# Altium footprint library Conectores.PcbLib: 122 footprints (part 4 of 8)
Each footprint in its own frame and in the unit in brackets; x right, y up, seen from the top. Pads: shape width x height; smd on the part's side, far side on the other; paste and mask are expansions set on the pad; w line width, h text height; cw(c..) or ccw(c..) is an arc to the next point about the centre after c.
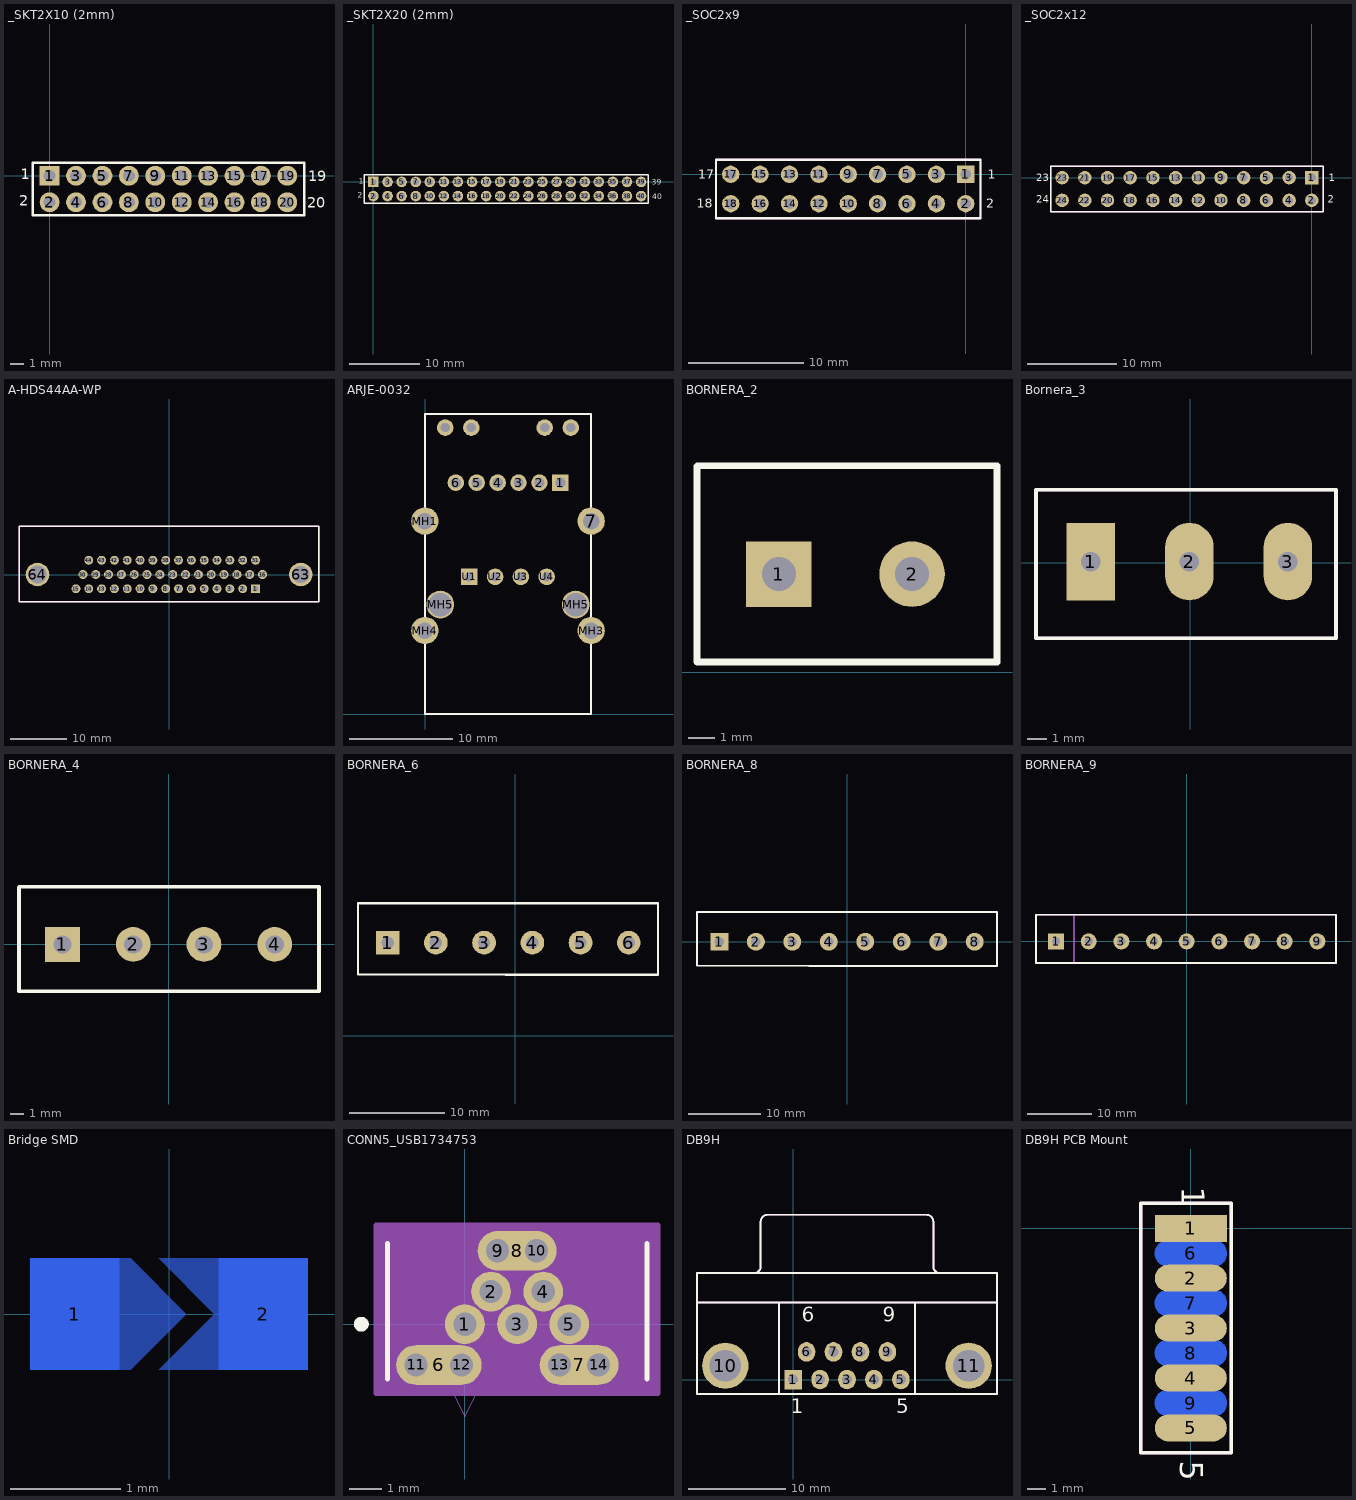
[diagram p3: the footprints below, top view; thin cyan lines are the x and y axes]

## _SKT2X10 (2mm) [mm] "Connector Socket; 20x2 Position (2mm pitch) P/N: SQW-110-01-F-D"
pads (20):
  rect 1.5x1.5 hole 0.9: 1(0,0)
  round 1.5 hole 0.9: 2(0,-2) 3(2,0) 4(2,-2) 5(4,0) 6(4,-2) 7(6,0) 8(6,-2) 9(8,0) 10(8,-2) 11(10,0) 12(10,-2) 13(12,0) 14(12,-2) 15(14,0) 16(14,-2) 17(16,0) 18(16,-2) 19(18,0) 20(18,-2)
Top Overlay:
  lines w0.2: -1.27,-3 19.27,-3 19.27,1 -1.27,1 -1.27,-3
  text "1" at -2.19,-0.27 h0.8
  text "2" at -2.32,-2.25 h0.8
  text "20" at 19.52,-2.42 h0.8
  text "19" at 19.6,-0.42 h0.8
3D body "SQW-110-01-F-D.stp": height 6.38, standoff -2.26, extent -1.148,-3 19.149,1

## _SKT2X20 (2mm) [mm] "Connector Socket; 20x2 Position (2mm pitch) P/N: SQW-120-01-F-D"
pads (40):
  rect 1.5x1.5 hole 0.9: 1(0,0)
  round 1.5 hole 0.9: 2(0,-2) 3(2,0) 4(2,-2) 5(4,0) 6(4,-2) 7(6,0) 8(6,-2) 9(8,0) 10(8,-2) 11(10,0) 12(10,-2) 13(12,0) 14(12,-2) 15(14,0) 16(14,-2) 17(16,0) 18(16,-2) 19(18,0) 20(18,-2) 21(20,0) 22(20,-2) 23(22,0) 24(22,-2) 25(24,0) 26(24,-2) 27(26,0) 28(26,-2) 29(28,0) 30(28,-2) 31(30,0) 32(30,-2) 33(32,0) 34(32,-2) 35(34,0) 36(34,-2) 37(36,0) 38(36,-2) 39(38,0) 40(38,-2)
Top Overlay:
  lines w0.2: -1.27,-3 39,-3 39,1 -1.27,1 -1.27,-3
  text "2" at -2.19,-2.27 h0.8
  text "1" at -2.1,-0.25 h0.8
  text "39" at 39.52,-0.42 h0.8
  text "40" at 39.6,-2.42 h0.8
3D body "SQW-120-01-F-D.stp": height 6.38, standoff -2.26, extent -1.148,-3 39.149,1

## _SOC2x9 [mm] "Socket 2x9, 2.54mm doble"
pads (18):
  rect 1.5x1.5 hole 0.9: 1(0,0)
  round 1.5 hole 0.9: 2(0,-2.54) 3(-2.54,0) 4(-2.54,-2.54) 5(-5.08,0) 6(-5.08,-2.54) 7(-7.62,0) 8(-7.62,-2.54) 9(-10.16,0) 10(-10.16,-2.54) 11(-12.7,0) 12(-12.7,-2.54) 13(-15.24,0) 14(-15.24,-2.54) 15(-17.78,0) 16(-17.78,-2.54) 17(-20.32,0) 18(-20.32,-2.54)
Top Overlay:
  lines w0.2: -21.59,-3.81 -21.59,1.27 1.27,1.27 1.27,-3.81 -21.59,-3.81
  text "2" at 1.778,-2.902 h0.8
  text "1" at 1.905,-0.362 h0.8
  text "17" at -23.114,-0.362 h0.8
  text "18" at -23.241,-2.902 h0.8
Mechanical 29:
  lines w0.2: -21.59,-3.81 1.27,-3.81 1.27,1.27 -21.59,1.27 -21.59,-3.81
  text "18" at -23.241,-2.902 h0.8
  text "17" at -23.114,-0.362 h0.8
  text "1" at 1.905,-0.362 h0.8
  text "2" at 1.778,-2.902 h0.8
  text "'.Designator'" at -21.35,1.73 h0.5
3D body "SOCKET HDR 9X2.STEP": height 3, standoff -8.85, extent -21.83,-3.683 1.27,1.167

## _SOC2x12 [mm] "Socket 2x12, 2.54mm doble fila"
pads (24):
  rect 1.5x1.5 hole 0.9: 1(0,0)
  round 1.5 hole 0.9: 2(0,-2.54) 3(-2.54,0) 4(-2.54,-2.54) 5(-5.08,0) 6(-5.08,-2.54) 7(-7.62,0) 8(-7.62,-2.54) 9(-10.16,0) 10(-10.16,-2.54) 11(-12.7,0) 12(-12.7,-2.54) 13(-15.24,0) 14(-15.24,-2.54) 15(-17.78,0) 16(-17.78,-2.54) 17(-20.32,0) 18(-20.32,-2.54) 19(-22.86,0) 20(-22.86,-2.54) 21(-25.4,0) 22(-25.4,-2.54) 23(-27.94,0) 24(-27.94,-2.54)
Top Overlay:
  lines w0.2: -29.21,-3.81 1.27,-3.81 1.27,1.27 -29.21,1.27 -29.21,-3.81
  text "24" at -30.861,-2.794 h0.8
  text "23" at -30.861,-0.381 h0.8
  text "2" at 1.778,-2.794 h0.8
  text "1" at 1.905,-0.381 h0.8
Mechanical 29:
  lines w0.2: -29.21,-3.81 -29.21,1.27 1.27,1.27 1.27,-3.81 -29.21,-3.81
  text "'.Designator'" at -4.54,1.8 h0.5
  text "1" at 1.905,-0.381 h0.8
  text "2" at 1.778,-2.794 h0.8
  text "23" at -30.861,-0.381 h0.8
  text "24" at -30.861,-2.794 h0.8
3D body "SOCKET HDR 12X2.STEP": height 8.5, standoff -3.35, extent -29.427,-3.748 1.573,1.102

## A-HDS44AA-WP [mm] "CONN DSUB HD PLUG 44POS R/A SLDR"
pads (46):
  rect 1.6x1.6 hole 1: 1(15.42,-2.54)
  round 1.6 hole 1: 2(13.13,-2.54) 3(10.84,-2.54) 4(8.55,-2.54) 5(6.26,-2.54) 6(3.97,-2.54) 7(1.68,-2.54) 8(-0.61,-2.54) 9(-2.9,-2.54) 10(-5.19,-2.54) 11(-7.48,-2.54) 12(-9.77,-2.54) 13(-12.06,-2.54) 14(-14.35,-2.54) 15(-16.64,-2.54) 16(16.67,0) 17(14.38,0) 18(12.09,0) 19(9.8,0) 20(7.51,0) 21(5.22,0) 22(2.93,0) 23(0.64,0) 24(-1.65,0) 25(-3.94,0) 26(-6.23,0) 27(-8.52,0) 28(-10.81,0) 29(-13.1,0) 30(-15.39,0) 31(15.42,2.54) 32(13.13,2.54) 33(10.84,2.54) 34(8.55,2.54) 35(6.26,2.54) 36(3.97,2.54) 37(1.68,2.54) 38(-0.61,2.54) 39(-2.9,2.54) 40(-5.19,2.54) 41(-7.48,2.54) 42(-9.77,2.54) 43(-12.06,2.54) 44(-14.35,2.54)
  round 4.2 hole 3.1: 63(23.5,0)
  round 4.2 hole 3.2: 64(-23.5,0)
Top Overlay:
  lines w0.254: -26.8,-4.87 -26.8,8.62 26.7,8.62 26.7,-4.87 -26.8,-4.87
Mechanical 29:
  lines w0.254: -26.75,-4.87 26.75,-4.87 26.75,8.62 -26.75,8.62 -26.75,-4.87
  text "1" at 16.95,-2.86 h0.8
  text "'.Designator'" at -25.708,7.238 h0.5
3D body "A-HDS44AA-WP Assman.STEP": height 17, standoff -4, extent -32.33,-2.905 32.17,18.545

## ARJE-0032 [mm]
pads (20):
  rect 1.6x1.6 hole 1: 1(13.124,22.453)
  round 1.6 hole 1: 2(11.094,22.453) 3(9.064,22.453) 4(7.034,22.453) 5(5.004,22.453) 6(2.974,22.453)
  round 2.65 hole 1.6: 7(16.104,18.723) MH1(-0.026,18.723) MH3(16.104,8.103) MH4(-0.026,8.103)
  round 1.6 hole 0.9: AGCYL(1.944,27.793) AGCYR(14.134,27.793) AYCGL(4.484,27.793) AYCGR(11.594,27.793) U2(6.789,13.313) U3(9.289,13.313) U4(11.789,13.313)
  round 2.7 hole 2.3 unplated: MH5(1.469,10.613) MH5(14.609,10.613)
  rect 1.6x1.6 hole 0.9: U1(4.289,13.313)
Top Overlay:
  lines w0.2: 0,0.003 0,29.11 16.104,29.11 16.104,0.003 0,0.003
Mechanical 29:
  lines w0.2: 0,0.003 16.104,0.003 16.104,29.11 0,29.11 0,0.003
  text "1" at 12.99,23.96 h0.8
  text "'.Designator'" at 0.562,0.498 h0.5
3D body "ARJE-0032.STEP": height 23.05, standoff -3.18, extent -1.693,-0.002 17.644,29.109

## BORNERA_2 [mm]
pads (2):
  rect 2.5x2.5 hole 1.3: 1(-24.52,3.75)
  round 2.5 hole 1.3: 2(-19.44,3.75)
Top Overlay:
  lines w0.254: -16.27,0.39 -16.28,0.4 -27.64,0.4 -27.64,7.86 -27.62,7.88 -16.2,7.88 -16.2,0.39
3D body "terminal_blocks_a-tb508-tc02.stp": height 9.95, standoff -3.4, extent -27.63,0.45 -16.27,7.95

## Bornera_3 [mm]
pads (3):
  rect 2.5x4 hole 1: 1(-5.128,0.06)
  oval 2.5x4 hole 1: 2(-0.048,0.06) 3(5.032,0.06)
Top Overlay:
  lines w0.2: -7.95,-3.888 -7.95,3.761 7.509,3.761 7.509,-3.888 -7.95,-3.888
Mechanical 29:
  lines w0.2: -7.95,-3.888 7.509,-3.888 7.509,3.761 -7.95,3.761 -7.95,-3.888
  text "'.Designator'" at -7.378,-3.362 h0.5
  text "1" at -5.24,2.46 h0.8
3D body "Bornera 3.step": height 1.74, standoff -10.55, extent -7.939,-3.903 7.561,3.797

## BORNERA_4 [mm]
pads (4):
  rect 2.5x2.5 hole 1.3: 1(-7.62,0)
  round 2.5 hole 1.3: 2(-2.54,0) 3(2.54,0) 4(7.62,0)
Top Overlay:
  lines w0.254: -10.74,-3.35 4.81,-3.35 4.82,-3.36 10.8,-3.36 10.8,4.13 -10.72,4.13 -10.74,4.11 -10.74,-3.35
3D body "terminal_blocks_a-tb508-tc04.stp": height 9.95, standoff -3.4, extent -10.76,-3.3 10.68,4.2

## BORNERA_6 [mm]
pads (6):
  rect 2.5x2.5 hole 1.3: 1(-13.43,9.8)
  round 2.5 hole 1.3: 2(-8.35,9.8) 3(-3.27,9.8) 4(1.81,9.8) 5(6.89,9.8) 6(11.97,9.8)
Top Overlay:
  lines w0.254: -16.55,6.45 -16.55,13.91 -16.53,13.93 15.05,13.93 15.05,6.44 -0.99,6.44 -1,6.45 -16.55,6.45
3D body "terminal_blocks_a-tb508-tc06.stp": height 9.95, standoff -3.4, extent -16.55,6.5 14.97,14

## BORNERA_8 [mm] "Bornera 9 contactos 2.54 mm pitch"
pads (8):
  rect 2.5x2.5 hole 1.3: 1(-17.78,0)
  round 2.5 hole 1.3: 2(-12.7,0) 3(-7.62,0) 4(-2.54,0) 5(2.54,0) 6(7.62,0) 7(12.7,0) 8(17.78,0)
Top Overlay:
  lines w0.254: -20.9,-3.35 -5.35,-3.35 -5.34,-3.36 20.89,-3.36 20.89,4.13 -20.88,4.13 -20.9,4.11 -20.9,-3.35
3D body "terminal_blocks_a-tb508-tc08.stp": height 9.95, standoff -3.4, extent -20.91,-3.35 20.69,4.15

## BORNERA_9 [mm] "Bornera 9 contactos 2.54 mm pitch"
pads (9):
  rect 2.5x2.5 hole 1.3: 1(-20.32,0)
  round 2.5 hole 1.3: 2(-15.24,0) 3(-10.16,0) 4(-5.08,0) 5(0,0) 6(5.08,0) 7(10.16,0) 8(15.24,0) 9(20.32,0)
Top Overlay:
  lines w0.254: -23.44,-3.35 -7.89,-3.35 -7.88,-3.36 23.22,-3.36 23.22,4.13 -23.42,4.13 -23.44,4.11 -23.44,-3.35
Mechanical 29:
  lines w0.254: -17.54,-3.38 -17.54,4.08 ; -23.44,-3.35 -23.44,4.11 -23.42,4.13 23.22,4.13 23.22,-3.36 -7.88,-3.36 -7.89,-3.35 -23.44,-3.35
  text "'.Designator'" at -16.27,-2.55 h0.5
3D body "terminal_blocks_a-tb508-tc09.stp": height 9.95, standoff -3.4, extent -23.42,-3.34 23.22,4.16

## Bridge SMD [mil]
pads (2):
  rect 32x40 smd far side: 1(-33.75,0) 2(33.75,0)
Bottom Layer:
  region: -23.75,20 -13.75,20 6.25,0 -13.75,-20 -23.75,-20
  region: 26.25,0 16.25,0 -3.75,20 26.25,20
  region: 26.25,0 16.25,0 -3.75,-20 26.25,-20
Bottom Paste:
  region: -23.75,20 -13.75,20 6.25,0 -13.75,-20 -23.75,-20
  region: 26.25,0 16.25,0 -3.75,20 26.25,20
  region: 26.25,0 16.25,0 -3.75,-20 26.25,-20
Bottom Solder:
  region: -23.75,24 -13.75,24 10.25,0 -13.75,-24 -23.75,-24
  region: 26.25,0 12.25,0 -11.75,24 26.25,24
  region: 26.25,0 12.25,0 -11.75,-24 26.25,-24
Mechanical 29:
  text "'.Designator'" at -39.76,-4.33 h19.68

## CONN5_USB1734753 [mil]
pads (14):
  round 48 hole 28 mask+0: 1(0,0) 2(31.5,39.37) 3(62.99,0) 4(94.49,39.37) 5(125.98,0)
  oval 103x48 smd: 6(-31.5,-49.21)
  oval 95x48 smd: 7(137.8,-49.21) 8(62.99,88.57)
  round 28 hole 28: 9(39.49,88.57) 10(86.49,88.57) 11(-59,-49.21) 12(-4,-49.21) 13(114.29,-49.21) 14(161.29,-49.21)
Top Overlay:
  circle w10: c-125,0 r4
  lines w6: -93.58,-66.42 -93.58,97.13 ; 219.57,-66.42 219.57,97.13
Mechanical 13:
  lines w1: -25,-61.42 0,-111.42 25,-61.42 ; -88.58,-61.42 214.57,-61.42 214.57,92.13 -88.58,92.13 -88.58,-61.42
Mechanical 15:
  region: 232.99,120 232.99,-83.33 -107.01,-83.33 -107.01,120
  region: 214.57,92.13 214.57,-61.42 -88.58,-61.42 -88.58,92.13
  lines w6: -107.01,-83.33 -107.01,120 232.99,120 232.99,-83.33 -107.01,-83.33
Multi-Layer:
  lines w1: -59,-63.21 -4,-63.21 ; -59,-35.21 -4,-35.21 ; 39.49,74.57 86.49,74.57 ; 39.49,102.57 86.49,102.57 ; 114.29,-63.21 161.29,-63.21 ; 114.29,-35.21 161.29,-35.21
3D body: height 10, standoff 0, extent 0,0 10,10
3D body "c-1734753-1-a-3d.stp": height 354.33, standoff -90.55, extent -87.79,-63.58 215.36,97.44

## DB9H [mm]
pads (11):
  rect 1.8x2 hole 1: 1(0,0)
  oval 1.8x2 hole 1: 2(2.77,0) 3(5.54,0) 4(8.31,0) 5(11.08,0) 6(1.385,2.84) 7(4.155,2.84) 8(6.925,2.84) 9(9.695,2.84)
  round 4.76 hole 3.26: 10(-6.955,1.42) 11(18.035,1.42)
Top Overlay:
  lines w0.2: -9.86,7.92 20.94,7.92 ; -4.02,10.925 ccw(c-4.02,11.62) -3.325,11.62 -3.325,16.22 ; -3.32,16.225 cw(c-2.625,16.225) -2.625,16.92 13.705,16.92 cw(c13.705,16.225) 14.4,16.225 ; -1.46,-1.48 -1.46,7.92 ; 12.54,-1.48 12.54,7.92 ; 14.405,16.22 14.405,11.62 ccw(c15.1,11.62) 15.1,10.925 ; -9.86,-1.48 20.94,-1.48 20.94,10.92 -9.86,10.92 -9.86,-1.48
  text "6" at 0.885,5.945 h1.5
  text "9" at 9.195,5.945 h1.5
  text "5" at 10.58,-3.455 h1.5
  text "1" at -0.25,-3.455 h1.5
Mechanical 29:
  lines w0.2: -9.86,7.92 20.94,7.92 ; -4.02,10.925 ccw(c-4.02,11.62) -3.325,11.62 -3.325,16.22 ; -3.32,16.225 cw(c-2.625,16.225) -2.625,16.92 13.705,16.92 cw(c13.705,16.225) 14.4,16.225 ; -1.46,-1.48 -1.46,7.92 ; 12.54,-1.48 12.54,7.92 ; 14.405,16.22 14.405,11.62 ccw(c15.1,11.62) 15.1,10.925 ; -9.86,-1.48 -9.86,10.92 20.94,10.92 20.94,-1.48 -9.86,-1.48
  text "1" at -0.25,-3.455 h1.5
  text "5" at 10.58,-3.455 h1.5
  text "9" at 9.195,5.945 h1.5
  text "6" at 0.885,5.945 h1.5
  text "'.Designator'" at -8.928,8.968 h0.5
3D body "DB9H PCB.STEP": height 12.58, standoff -3.14, extent -9.841,-2.082 20.969,16.993

## DB9H PCB Mount [mm] "DB9H para montar entre PCB"
pads (9):
  rect 4x1.5 smd: 1(0,0)
  oval 4x1.5 smd: 2(0,-2.77) 3(0,-5.54) 4(0,-8.31) 5(0,-11.08)
  oval 4x1.5 smd far side: 6(0,-1.385) 7(0,-4.155) 8(0,-6.925) 9(0,-9.695)
Top Overlay:
  lines w0.2: -2.77,-12.465 -2.77,1.385 2.235,1.385 2.235,-12.465 -2.77,-12.465
  text "5" at -0.6,-12.9 h1.27
  text "1" at -0.5,2.3 h1.27
Mechanical 29:
  lines w0.2: -2.77,-12.465 2.235,-12.465 2.235,1.385 -2.77,1.385 -2.77,-12.465
  text "'.Designator'" at -1.878,-12.038 h0.5
  text "1" at -0.5,2.3 h1.27
  text "5" at -0.6,-12.9 h1.27